# Altium footprint library B105rlc.PcbLib: 103 footprints (part 5 of 7)
Each footprint in its own frame and in the unit in brackets; x right, y up, seen from the top. Pads: shape width x height; smd on the part's side, far side on the other; paste and mask are expansions set on the pad; w line width, h text height; cw(c..) or ccw(c..) is an arc to the next point about the centre after c.
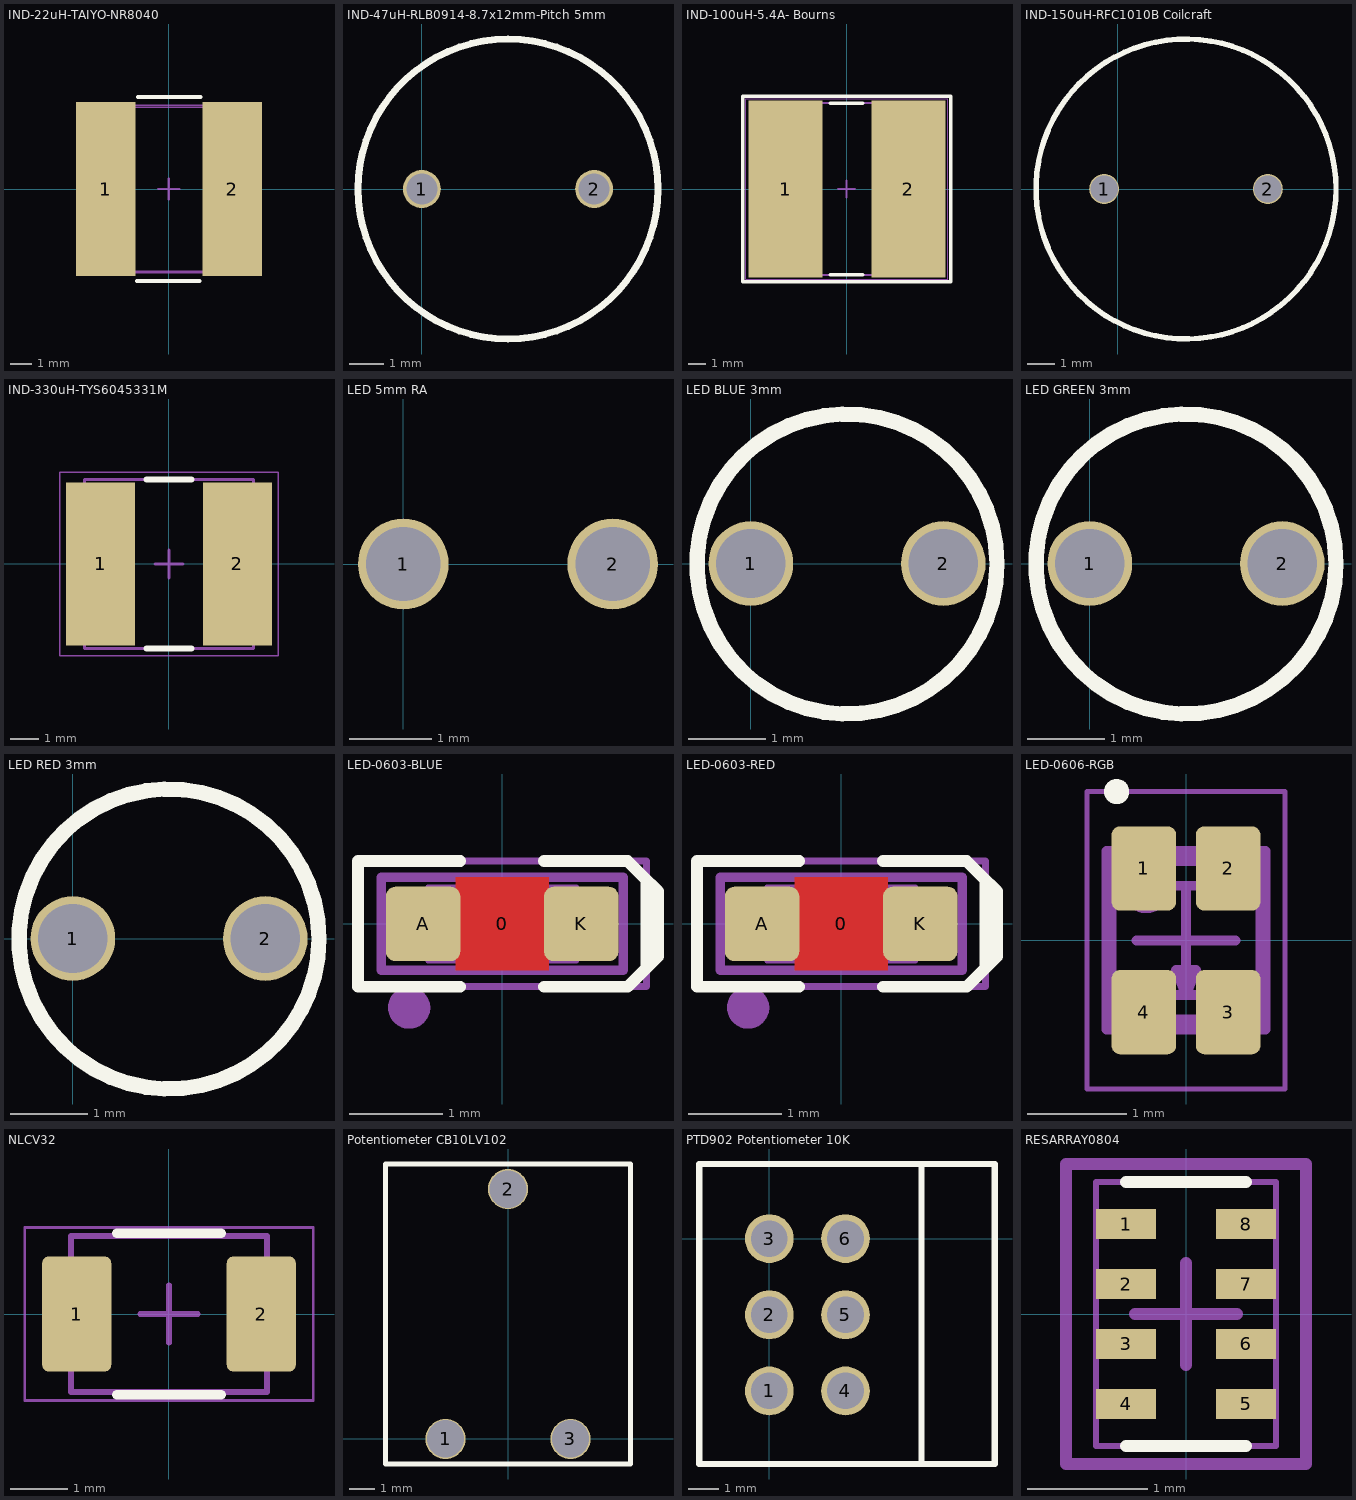
[diagram p4: the footprints below, top view; thin cyan lines are the x and y axes]

## IND-22uH-TAIYO-NR8040 [mm]
height 4.5
pads (2):
  rect 2.8x8.2 smd: 1(-2.975,0) 2(2.995,0)
Top Overlay:
  lines w0.2: -1.5,-4.35 1.45,-4.35 ; -1.45,4.35 1.5,4.35
Mechanical 13:
  lines w0.1: -4.1,-3.95 -4.1,3.95 4.1,3.95 4.1,-3.95 -4.1,-3.95
Mechanical 15:
  lines w0.05: -4,-3.85 -4,3.85 4,3.85 4,-3.85 -4,-3.85
  lines w0.1: -0.5,0 0.5,0 ; 0,-0.5 0,0.5
3D body "Inductor 6.2mm.step": height 2.5, standoff 0, extent -3.053,-3.106 3.153,3.1

## IND-47uH-RLB0914-8.7x12mm-Pitch 5mm [mm]
pads (2):
  round 1.1 hole 0.9: 1(0,0) 2(5,0)
Top Overlay:
  circle w0.2: c2.5,0 r4.351
3D body "Inductor RLB 0914 .step": height 12, standoff -25, extent -1.85,-4.35 6.85,4.35

## IND-100uH-5.4A- Bourns [mm] "Precision Wire Wound Inductor, 2-Leads, Body 10,00x10,00mm, IPC Medium Density"
height 6
pads (2):
  rect 4.3x10.3 smd: 1(-3.55,0) 2(3.6,0)
Top Overlay:
  lines w0.2: -0.95,-5 0.95,-5 ; -0.95,5 0.95,5 ; -6.05,-5.4 6.05,-5.4 6.05,5.4 -6.05,5.4 -6.05,-5.4
Mechanical 13:
  lines w0.1: -5,-5 -5,5 5,5 5,-5 -5,-5
Mechanical 15:
  lines w0.05: -5.875,-5.25 -5.875,5.25 5.875,5.25 5.875,-5.25 -5.875,-5.25
  lines w0.1: -0.5,0 0.5,0 ; 0,-0.5 0,0.5
3D body "Inductor-SRN1060.step": height 6.1, standoff 0, extent -4.95,-5 4.85,5

## IND-150uH-RFC1010B Coilcraft [mm]
pads (2):
  round 1.1 hole 1: 1(-0.5,0) 2(5.5,0)
Top Overlay:
  circle w0.2: c2.5,0 r5.5
3D body "Coilcraft-RFC1010B Inductor.step": height 11.5, standoff -3.8, extent -3,-5.5 8,5.5

## IND-330uH-TYS6045331M [mm]
height 4.5
pads (2):
  rect 2.45x5.8 smd: 1(-2.425,0) 2(2.425,0)
Top Overlay:
  lines w0.2: -0.8,-3 0.8,-3 ; -0.8,3 0.8,3
Mechanical 13:
  lines w0.1: -3,-3 -3,3 3,3 3,-3 -3,-3
Mechanical 15:
  lines w0.05: -3.875,-3.25 -3.875,3.25 3.875,3.25 3.875,-3.25 -3.875,-3.25
  lines w0.1: -0.5,0 0.5,0 ; 0,-0.5 0,0.5
3D body "Inductor 6.2mm.step": height 2.5, standoff 0, extent -3.153,-3.106 3.053,3.1

## LED 5mm RA [mm]
pads (2):
  round 1.1 hole 0.9: 1(0,0) 2(2.54,0)
3D body "150A9VS.STEP": height 6.22, standoff -3.68, extent -1.84,-10.17 4.38,3.97

## LED BLUE 3mm [mm]
pads (2):
  round 1.1 hole 0.9: 1(0,0) 2(2.5,0)
Top Overlay:
  circle w0.2: c1.249,-0.006 r1.949
3D body "User Library-LED_d3-BLU.STEP": height 4.98, standoff -2.5, extent -0.363,-1.648 2.85,1.648

## LED GREEN 3mm [mm]
pads (2):
  round 1.1 hole 0.9: 1(0,0) 2(2.5,0)
Top Overlay:
  circle w0.2: c1.249,-0.006 r1.949
3D body "SW3dPS-LEDd3G.STEP": height 5.51, standoff -2.49, extent -0.394,-1.649 2.906,1.64

## LED RED 3mm [mm]
pads (2):
  round 1.1 hole 0.9: 1(0,0) 2(2.5,0)
Top Overlay:
  circle w0.2: c1.249,-0.006 r1.949
3D body "SW3dPS-LEDd3R.STEP": height 5.51, standoff -2.49, extent -0.4,-1.639 2.9,1.65

## LED-0603-BLUE [mm]
pads (3):
  round 0.254 on Mech15: 0(0,0)
  rrect25% 0.8x0.8 smd: A(-0.85,0) K(0.85,0)
Top Layer:
  pour cut-out: -0.5,0.5 0.5,0.5 0.5,-0.5 -0.5,-0.5
Top Overlay:
  lines w0.127: -0.45,-0.675 -1.55,-0.675 -1.55,0.675 -0.45,0.675 ; 0.45,-0.675 1.35,-0.675 1.55,-0.475 1.55,0.475 1.35,0.675 0.45,0.675 ; 1.5,0.525 1.675,0.35 1.675,-0.35 1.525,-0.5
Mechanical 5:
  circle w0.254: c-1,-0.9 r0.1
  lines w0.1: -1.3,-0.5 1.3,-0.5 1.3,0.5 -1.3,0.5 -1.3,-0.5
  text ".Designator" at 0.8,0.3 h0.64
Mechanical 13:
  lines w0.05: -0.6,-0.4 -0.6,0.399 0.6,0.4 0.6,-0.4 -0.6,-0.399 ; -0.505,-0.398 -0.505,0.398 ; -0.5,-0.4 -0.8,-0.4 -0.8,0.4 -0.5,0.4 ; 0.5,-0.4 0.8,-0.4 0.8,0.4 0.5,0.4 ; 0.505,-0.398 0.505,0.398 ; -0.599,-0.398 0.599,-0.398 0.599,0.398 -0.599,0.398 -0.599,-0.398
Mechanical 15:
  lines w0.076: -1.55,-0.675 1.55,-0.675 1.55,0.675 -1.55,0.675 -1.55,-0.675
3D body "LED 0603 APT1608 BLUE.STEP": height 0.75, standoff 0, extent -0.8,-0.4 0.8,0.4

## LED-0603-RED [mm]
pads (3):
  round 0.254 on Mech15: 0(0,0)
  rrect25% 0.8x0.8 smd: A(-0.85,0) K(0.85,0)
Top Layer:
  pour cut-out: -0.5,0.5 0.5,0.5 0.5,-0.5 -0.5,-0.5
Top Overlay:
  lines w0.127: -0.45,-0.675 -1.55,-0.675 -1.55,0.675 -0.45,0.675 ; 0.45,-0.675 1.35,-0.675 1.55,-0.475 1.55,0.475 1.35,0.675 0.45,0.675 ; 1.5,0.525 1.675,0.35 1.675,-0.35 1.525,-0.5
Mechanical 5:
  circle w0.254: c-1,-0.9 r0.1
  lines w0.1: -1.3,-0.5 1.3,-0.5 1.3,0.5 -1.3,0.5 -1.3,-0.5
  text ".Designator" at -0.8,-0.3 h0.64
Mechanical 13:
  lines w0.05: -0.6,-0.4 -0.6,0.399 0.6,0.4 0.6,-0.4 -0.6,-0.399 ; -0.505,-0.398 -0.505,0.398 ; -0.5,-0.4 -0.8,-0.4 -0.8,0.4 -0.5,0.4 ; 0.5,-0.4 0.8,-0.4 0.8,0.4 0.5,0.4 ; 0.505,-0.398 0.505,0.398 ; -0.599,-0.398 0.599,-0.398 0.599,0.398 -0.599,0.398 -0.599,-0.398
Mechanical 15:
  lines w0.076: -1.55,-0.675 -1.55,0.675 1.55,0.675 1.55,-0.675 -1.55,-0.675
3D body "LED 0603 APT1608 RED.STEP": height 0.75, standoff 0, extent -0.8,-0.4 0.8,0.4

## LED-0606-RGB [mm]
pads (4):
  rrect25% 0.65x0.85 smd paste+0: 1(-0.425,0.725) 2(0.425,0.725) 3(0.425,-0.725) 4(-0.425,-0.725)
Top Overlay:
  circle w0.2: c-0.7,1.5 r0.026
Mechanical 5:
  circle w0.254: c-0.4,0.5 r0.1
  lines w0.1: -0.8,-0.9 -0.8,0.9 0.8,0.9 0.8,-0.9 -0.8,-0.9
  text ".Designator" at 0,0.7 h0.64
Mechanical 13:
  lines w0.1: -0.75,-0.55 0.75,-0.55 ; -0.75,0.55 0.75,0.55 ; -0.02,-0.5 0,-0.3 ; 0.75,0.55 0.75,0.55 ; 0.75,0.55 0.75,-0.8 -0.75,-0.8 -0.75,0.8 0.75,0.8 0.75,0.55 ; -0.1,-0.3 0.1,-0.3 0,-0.55 -0.1,-0.3
Mechanical 15:
  lines w0.05: -1,-1.5 -1,1.5 1,1.5 1,-1.5 -1,-1.5
  lines w0.1: -0.5,0 0.5,0 ; 0,-0.5 0,0.5
3D body "User Library-HSMF-C114.step": height 0.34, standoff -0.01, extent -0.75,-0.8 0.75,0.8

## NLCV32 [mm]
pads (2):
  rrect20% 1.2x2 smd: 1(-1.6,0) 2(1.6,0)
Top Overlay:
  lines w0.17: -0.9,-1.4 0.9,-1.4 ; -0.9,1.4 0.9,1.4
Mechanical 5:
  lines w0.1: -1.7,-1.35 1.7,-1.35 1.7,1.35 -1.7,1.35 -1.7,-1.35
  text ".Designator" at -0.5,0.8 h0.9
Mechanical 13:
  lines w0.1: -1.7,-1.35 -1.7,1.35 1.7,1.35 1.7,-1.35 -1.7,-1.35
Mechanical 15:
  lines w0.05: -2.5,-1.5 -2.5,1.5 2.5,1.5 2.5,-1.5 -2.5,-1.5
  lines w0.1: -0.5,0 0.5,0 ; 0,-0.5 0,0.5
3D body: height 2.4, standoff 0, extent -1.699,-1.349 1.699,1.349

## Potentiometer CB10LV102 [mm]
pads (3):
  round 1.6 hole 1.5: 1(-2.5,0) 2(0,10) 3(2.5,0)
Top Overlay:
  lines w0.2: -4.9,-1 -4.9,11 4.9,11 4.9,-1 -4.9,-1
3D body: height 6, standoff 0, extent -4.9,-0.5 4.9,10.5

## PTD902 Potentiometer 10K [mm]
pads (6):
  round 1.6 hole 1.2: 1(0,-5) 2(0,-2.5) 3(0,0) 4(2.5,-5) 5(2.5,-2.5) 6(2.5,0)
Top Overlay:
  lines w0.2: 2.6,-7.4 7.4,-7.4 7.4,2.45 5,2.45 ; 5,2.45 5,-7.4 -2.3,-7.4 -2.3,2.45 5,2.45
3D body "User Library-Bournes Potentiometer PTD90 Series-1.step": height 11.8, standoff -3, extent -2.152,-7.25 22.5,2.25

## RESARRAY0804 [mm]
pads (8):
  rect 0.5x0.25 smd mask+0.025: 1(-0.5,0.75) 2(-0.5,0.25) 3(-0.5,-0.25) 4(-0.5,-0.75) 5(0.5,-0.75) 6(0.5,-0.25) 7(0.5,0.25) 8(0.5,0.75)
Top Overlay:
  lines w0.1: -0.5,-1.1 0.5,-1.1 ; -0.5,1.1 0.5,1.1
Mechanical 5:
  lines w0.05: -0.75,-1.1 -0.75,1.1 0.75,1.1 0.75,-1.1 -0.75,-1.1
  text ".Designator" at 0.225,-0.825 h0.46
Mechanical 15:
  lines w0.1: -0.425,0 0.425,0 ; 0,-0.425 0,0.425 ; -1,-1.25 1,-1.25 1,1.25 -1,1.25 -1,-1.25
3D body "User Library-YC124-1.step": height 0.45, standoff 0, extent -0.5,-1 0.5,1